# Altium footprint library Semi-ATE.PcbLib: 155 footprints (part 7 of 10)
Each footprint in its own frame and in the unit in brackets; x right, y up, seen from the top. Pads: shape width x height; smd on the part's side, far side on the other; paste and mask are expansions set on the pad; w line width, h text height; cw(c..) or ccw(c..) is an arc to the next point about the centre after c.
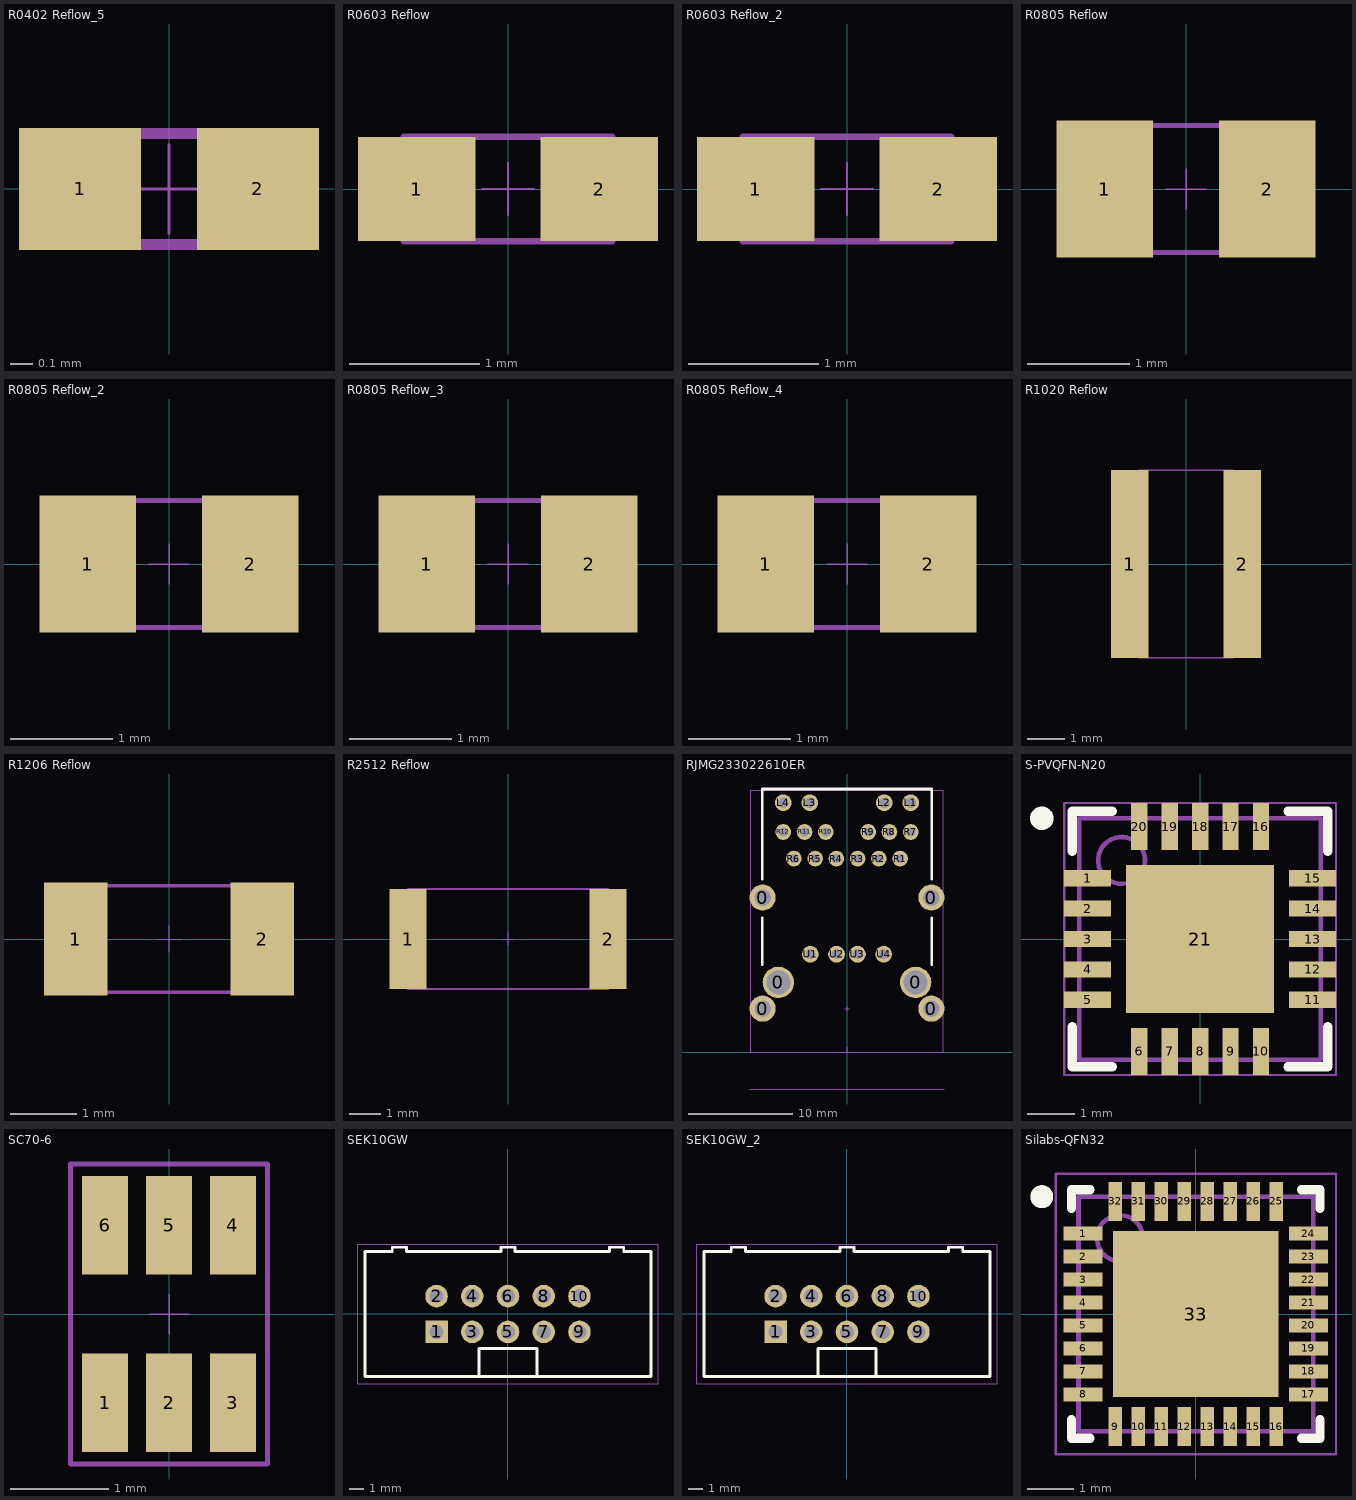
[diagram p6: the footprints below, top view; thin cyan lines are the x and y axes]

## R0402 Reflow_5 [mm]
pads (2):
  rect 0.55x0.55 smd: 1(-0.4,0) 2(0.4,0)
Top Solder:
  rectangle: -0.3,-0.377 0.3,0.377
Top Designator:
  text ".Designator" at -7.618,-0.508 h1.52
Top 3D Body:
  lines w0.05: -0.5,-0.25 -0.5,0.25 0.5,0.25 0.5,-0.25 -0.5,-0.25
Bottom Gold Plating:
  lines w0.013: -0.2,0 0.2,0 ; 0,-0.2 0,0.2
3D body "R0402.STEP": height 0.35, standoff 0, extent -0.5,-0.25 0.5,0.25

## R0603 Reflow [mm] "SMT Resistor 0603 Reflow Soldering"
pads (2):
  rect 0.9x0.8 smd: 1(-0.7,0) 2(0.7,0)
Top Designator:
  text ".Designator" at -7.618,-0.508 h1.52
Top 3D Body:
  lines w0.05: -0.8,-0.4 0.8,-0.4 0.8,0.4 -0.8,0.4 -0.8,-0.4
Bottom Gold Plating:
  lines w0.013: -0.2,0 0.2,0 ; 0,-0.2 0,0.2
3D body "R0603.STEP": height 0.45, standoff 0, extent -0.8,-0.4 0.8,0.4

## R0603 Reflow_2 [mm]
pads (2):
  rect 0.9x0.8 smd: 1(-0.7,0) 2(0.7,0)
Top Designator:
  text ".Designator" at -7.618,-0.508 h1.52
Top 3D Body:
  lines w0.05: -0.8,-0.4 0.8,-0.4 0.8,0.4 -0.8,0.4 -0.8,-0.4
Bottom Gold Plating:
  lines w0.013: -0.2,0 0.2,0 ; 0,-0.2 0,0.2
3D body "R0603.STEP": height 0.45, standoff 0, extent -0.8,-0.4 0.8,0.4

## R0805 Reflow [mm] "SMT Resistor 0805 Reflow Soldering"
height 10
pads (2):
  rect 0.95x1.35 smd: 1(-0.8,0) 2(0.8,0)
Top Designator:
  text ".Designator" at -7.618,-0.508 h1.52
Top 3D Body:
  lines w0.05: -1,-0.625 1,-0.625 1,0.625 -1,0.625 -1,-0.625
Bottom Gold Plating:
  lines w0.013: -0.2,0 0.2,0 ; 0,-0.2 0,0.2
3D body "R0805.STEP": height 0.6, standoff 0, extent -1,-0.625 1,0.625

## R0805 Reflow_2 [mm]
pads (2):
  rect 0.95x1.35 smd: 1(-0.8,0) 2(0.8,0)
Top Designator:
  text ".Designator" at -7.618,-0.508 h1.52
Top 3D Body:
  lines w0.05: -1,-0.625 -1,0.625 1,0.625 1,-0.625 -1,-0.625
Bottom Gold Plating:
  lines w0.013: -0.2,0 0.2,0 ; 0,-0.2 0,0.2
3D body "R0805.STEP": height 0.6, standoff 0, extent -1,-0.625 1,0.625

## R0805 Reflow_3 [mm]
pads (2):
  rect 0.95x1.35 smd: 1(-0.8,0) 2(0.8,0)
Top Designator:
  text ".Designator" at -7.618,-0.508 h1.52
Top 3D Body:
  lines w0.05: -1,-0.625 -1,0.625 1,0.625 1,-0.625 -1,-0.625
Bottom Gold Plating:
  lines w0.013: -0.2,0 0.2,0 ; 0,-0.2 0,0.2
3D body "R0805.STEP": height 0.6, standoff 0, extent -1,-0.625 1,0.625

## R0805 Reflow_4 [mm]
pads (2):
  rect 0.95x1.35 smd: 1(-0.8,0) 2(0.8,0)
Top Designator:
  text ".Designator" at -7.618,-0.508 h1.52
Top 3D Body:
  lines w0.05: -1,-0.625 1,-0.625 1,0.625 -1,0.625 -1,-0.625
Bottom Gold Plating:
  lines w0.013: -0.2,0 0.2,0 ; 0,-0.2 0,0.2
3D body "R0805.STEP": height 0.6, standoff 0, extent -1,-0.625 1,0.625

## R1020 Reflow [mm] "SMT Resistor 0805 Reflow Soldering"
pads (2):
  rect 1x5 smd: 1(-1.5,0) 2(1.5,0)
Top Designator:
  text ".Designator" at -7.618,-0.508 h1.52
Top 3D Body:
  lines w0.05: -1.25,-2.5 1.25,-2.5 1.25,2.5 -1.25,2.5 -1.25,-2.5
3D body "R1020.STEP": height 0.63, standoff -0.02, extent -1.25,-2.5 1.25,2.5

## R1206 Reflow [mm] "SMT Resistor 1206 Reflow Soldering"
pads (2):
  rect 0.95x1.7 smd: 1(-1.4,0) 2(1.4,0)
Top Designator:
  text ".Designator" at -7.618,-0.508 h1.52
Top 3D Body:
  lines w0.05: -1.6,-0.8 1.6,-0.8 1.6,0.8 -1.6,0.8 -1.6,-0.8
Bottom Gold Plating:
  lines w0.013: -0.2,0 0.2,0 ; 0,-0.2 0,0.2
3D body "R1206.STEP": height 0.6, standoff 0, extent -1.6,-0.8 1.6,0.8

## R2512 Reflow [mm] "SMT Resistor 2512 Reflow Soldering"
pads (2):
  rect 1.2x3.2 smd: 1(-3.2,0) 2(3.2,0)
Top Designator:
  text ".Designator" at -7.618,-0.508 h1.52
Top 3D Body:
  lines w0.05: -3.2,-1.6 3.2,-1.6 3.2,1.6 -3.2,1.6 -3.2,-1.6
Bottom Gold Plating:
  lines w0.013: -0.2,0 0.2,0 ; 0,-0.2 0,0.2
3D body "R2512.STEP": height 0.6, standoff 0, extent -3.2,-1.6 3.2,1.6

## RJMG233022610ER [mm] "RJ45 + USB"
pads (26):
  round 2.5 hole 1.57: 0(-8.065,4.18) 0(-8.065,14.8) 0(8.065,4.18) 0(8.065,14.8)
  round 3 hole 2.3: 0(-6.565,6.69) 0(6.565,6.69)
  round 1.6 hole 0.97: L1(6.09,23.87) L2(3.555,23.87) L3(-3.555,23.87) L4(-6.09,23.87) U1(-3.5,9.39) U2(-1,9.39) U3(1,9.39) U4(3.5,9.39)
  round 1.5 hole 0.89: R1(5.075,18.53) R2(3.045,18.53) R3(1.015,18.53) R4(-1.015,18.53) R5(-3.045,18.53) R6(-5.075,18.53) R7(6.09,21.07) R8(4.06,21.07) R9(2.03,21.07) R10(-2.03,21.07) R11(-4.06,21.07) R12(-6.09,21.07)
Top Overlay:
  lines w0.254: -8.1,8.38 -8.1,12.88 ; -8.1,16.58 -8.1,25.18 ; -8.065,25.18 8.1,25.18 8.1,16.58 ; 8.1,8.38 8.1,12.88
Top Designator:
  text ".Designator" at -7.618,-10.649 h1.52
Top 3D Body:
  lines w0.05: -9.209,0 -9.209,25.07 9.209,25.07 9.209,0 0,0 -9.209,0
Bottom Gold Plating:
  lines w0.012: 0,0 0,0.49
  lines w0.013: -9.3,-3.5 9.3,-3.5 ; -9.3,0 9.3,0 ; -0.2,4.18 0.2,4.18 ; 0,3.98 0,4.38
3D body "RJMG233022610ER.STEP": height 23, standoff -3.43, extent -9.209,-45.589 9.209,25.07

## S-PVQFN-N20 [mm] "(RGW) QFN 5mmx5mm, RM 0.65mm"
height 1
pads (21):
  rect 1x0.35 smd: 1(-2.4,1.3) 2(-2.4,0.65) 3(-2.4,0) 4(-2.4,-0.65) 5(-2.4,-1.3) 11(2.4,-1.3) 12(2.4,-0.65) 13(2.4,0) 14(2.4,0.65) 15(2.4,1.3)
  rect 0.35x1 smd: 6(-1.3,-2.4) 7(-0.65,-2.4) 8(0,-2.4) 9(0.65,-2.4) 10(1.3,-2.4) 16(1.3,2.4) 17(0.65,2.4) 18(0,2.4) 19(-0.65,2.4) 20(-1.3,2.4)
  rect 3.15x3.15 smd: 21(0,0)
Top Overlay:
  circle w0.25: c-3.375,2.575 r0.125
  lines w0.2: -2.725,-1.875 -2.725,-2.725 -1.875,-2.725 ; -2.725,1.875 -2.725,2.725 -1.875,2.725 ; 1.875,-2.725 2.725,-2.725 2.725,-1.875 ; 1.875,2.725 2.725,2.725 2.725,1.875
Top Designator:
  text ".Designator" at -7.929,-0.508 h1.52
Top 3D Body:
  lines w0.05: -2.9,-2.9 -2.9,2.9 2.9,2.9 2.9,-2.9 -2.9,-2.9
Bottom 3D Body:
  circle w0.1: c-1.675,1.675 r0.5
  lines w0.1: -2.575,-2.575 2.575,-2.575 2.575,2.575 -2.575,2.575 -2.575,-2.575
Bottom Gold Plating:
  lines w0.1: -0.5,0 0.5,0 ; 0,-0.5 0,0.5
3D body: height 1, standoff 0, extent -2.575,-2.575 2.575,2.575

## SC70-6 [mm]
pads (6):
  rect 0.47x1 smd: 1(-0.65,-0.9) 2(0,-0.9) 3(0.65,-0.9) 4(0.65,0.9) 5(0,0.9) 6(-0.65,0.9)
Top Overlay:
  text "." at -0.65,-1.784 h1
Top Designator:
  text ".Designator" at -7.64,-0.836 h1.52
Top 3D Body:
  lines w0.05: -1,-1.524 -1,1.524 1,1.524 1,-1.524 -1,-1.524
Bottom Gold Plating:
  lines w0.013: -0.2,0 0.2,0 ; 0,-0.2 0,0.2
3D body "SC70-6.STEP": height 0.95, standoff 0, extent -1,-1.05 1,1.05

## SEK10GW [mm]
height 9.45
pads (10):
  rect 1.6x1.6 hole 1: 1(-5.08,-1.27)
  round 1.6 hole 1: 2(-5.08,1.27) 3(-2.54,-1.27) 4(-2.54,1.27) 5(0,-1.27) 6(0,1.27) 7(2.54,-1.27) 8(2.54,1.27) 9(5.08,-1.27) 10(5.08,1.27)
Top Overlay:
  lines w0.2: -2.05,-4.45 -2.05,-2.45 2.05,-2.45 2.05,-4.45 ; 1.91,-4.45 10.16,-4.45 ; 2.81,-4.45 4.81,-4.45 ; 10.16,-4.45 10.16,4.45 8.22,4.45 8.22,4.75 7.22,4.75 7.22,4.45 0.5,4.45 0.5,4.75 -0.5,4.75 -0.5,4.45 -7.22,4.45 -7.22,4.75 -8.22,4.75 -8.22,4.45 -10.16,4.45 -10.16,-4.45 10.16,-4.45
Top Designator:
  text ".Designator" at -7.618,-0.508 h1.52
Top 3D Body:
  lines w0.05: -10.66,-4.95 -10.66,4.95 10.66,4.95 10.66,-4.95 -10.66,-4.95
Bottom 3D Body:
  lines w0.1: -5.395,-1.585 -5.395,-0.955 ; -5.395,-1.585 -5.395,-0.955 ; -5.395,-1.585 -4.765,-1.585 ; -5.395,-1.585 -4.765,-1.585 ; -5.395,-0.955 -4.765,-0.955 ; -5.395,-0.955 -4.765,-0.955 ; -5.395,0.955 -4.765,0.955 ; -5.395,0.955 -5.395,1.585 ; -5.395,0.955 -5.395,1.585 ; -5.395,0.955 -4.765,0.955 ; -5.395,1.585 -4.765,1.585 ; -5.395,1.585 -4.765,1.585 ; -4.765,-1.585 -4.765,-0.955 ; -4.765,-1.585 -4.765,-0.955 ; -4.765,0.955 -4.765,1.585 ; -4.765,0.955 -4.765,1.585 ; -2.855,-1.585 -2.225,-1.585 ; -2.855,-1.585 -2.855,-0.955 ; -2.855,-1.585 -2.855,-0.955 ; -2.855,-1.585 -2.225,-1.585 ; -2.855,-0.955 -2.225,-0.955 ; -2.855,-0.955 -2.225,-0.955 ; -2.855,0.955 -2.855,1.585 ; -2.855,0.955 -2.855,1.585 ; -2.855,0.955 -2.225,0.955 ; -2.855,0.955 -2.225,0.955 ; -2.855,1.585 -2.225,1.585 ; -2.855,1.585 -2.225,1.585 ; -2.225,-1.585 -2.225,-0.955 ; -2.225,-1.585 -2.225,-0.955 ; -2.225,0.955 -2.225,1.585 ; -2.225,0.955 -2.225,1.585 ; -0.315,-1.585 -0.315,-0.955 ; -0.315,-1.585 0.315,-1.585 ; -0.315,-1.585 -0.315,-0.955 ; -0.315,-1.585 0.315,-1.585 ; -0.315,-0.955 0.315,-0.955 ; -0.315,-0.955 0.315,-0.955 ; -0.315,0.955 -0.315,1.585 ; -0.315,0.955 -0.315,1.585 ; -0.315,0.955 0.315,0.955 ; -0.315,0.955 0.315,0.955 ; -0.315,1.585 0.315,1.585 ; -0.315,1.585 0.315,1.585 ; 0.315,-1.585 0.315,-0.955 ; 0.315,-1.585 0.315,-0.955 ; 0.315,0.955 0.315,1.585 ; 0.315,0.955 0.315,1.585 ; 2.225,-1.585 2.225,-0.955 ; 2.225,-1.585 2.225,-0.955 ; 2.225,-1.585 2.855,-1.585 ; 2.225,-1.585 2.855,-1.585 ; 2.225,-0.955 2.855,-0.955 ; 2.225,-0.955 2.855,-0.955 ; 2.225,0.955 2.225,1.585 ; 2.225,0.955 2.225,1.585 ; 2.225,0.955 2.855,0.955 ; 2.225,0.955 2.855,0.955 ; 2.225,1.585 2.855,1.585 ; 2.225,1.585 2.855,1.585 ; 2.855,-1.585 2.855,-0.955 ; 2.855,-1.585 2.855,-0.955 ; 2.855,0.955 2.855,1.585 ; 2.855,0.955 2.855,1.585 ; 4.765,-1.585 4.765,-0.955 ; 4.765,-1.585 4.765,-0.955 ; 4.765,-1.585 5.395,-1.585 ; 4.765,-1.585 5.395,-1.585 ; 4.765,-0.955 5.395,-0.955 ; 4.765,-0.955 5.395,-0.955 ; 4.765,0.955 4.765,1.585 ; 4.765,0.955 5.395,0.955 ; 4.765,0.955 5.395,0.955 ; 4.765,0.955 4.765,1.585 ; 4.765,1.585 5.395,1.585 ; 4.765,1.585 5.395,1.585 ; 5.395,-1.585 5.395,-0.955 ; 5.395,-1.585 5.395,-0.955 ; 5.395,0.955 5.395,1.585 ; 5.395,0.955 5.395,1.585
3D body "0918_SEK_low_profile_male_header_straight_10-pin_2_9_PCB.stp": height 9.4, standoff -3.25, extent -10.16,-4.45 10.16,4.75

## SEK10GW_2 [mm]
pads (10):
  rect 1.6x1.6 hole 1: 1(-5.08,-1.27)
  round 1.6 hole 1: 2(-5.08,1.27) 3(-2.54,-1.27) 4(-2.54,1.27) 5(0,-1.27) 6(0,1.27) 7(2.54,-1.27) 8(2.54,1.27) 9(5.08,-1.27) 10(5.08,1.27)
Top Overlay:
  lines w0.2: -2.05,-4.45 -2.05,-2.45 2.05,-2.45 2.05,-4.45 ; 1.91,-4.45 10.16,-4.45 ; 2.81,-4.45 4.81,-4.45 ; 10.16,-4.45 10.16,4.45 8.22,4.45 8.22,4.75 7.22,4.75 7.22,4.45 0.5,4.45 0.5,4.75 -0.5,4.75 -0.5,4.45 -7.22,4.45 -7.22,4.75 -8.22,4.75 -8.22,4.45 -10.16,4.45 -10.16,-4.45 10.16,-4.45
Top Designator:
  text ".Designator" at -7.618,-0.508 h1.52
Top 3D Body:
  lines w0.05: -10.66,-4.95 -10.66,4.95 10.66,4.95 10.66,-4.95 -10.66,-4.95
Bottom 3D Body:
  lines w0.1: -5.395,-1.585 -5.395,-0.955 ; -5.395,-1.585 -5.395,-0.955 ; -5.395,-1.585 -4.765,-1.585 ; -5.395,-1.585 -4.765,-1.585 ; -5.395,-0.955 -4.765,-0.955 ; -5.395,-0.955 -4.765,-0.955 ; -5.395,0.955 -4.765,0.955 ; -5.395,0.955 -5.395,1.585 ; -5.395,0.955 -5.395,1.585 ; -5.395,0.955 -4.765,0.955 ; -5.395,1.585 -4.765,1.585 ; -5.395,1.585 -4.765,1.585 ; -4.765,-1.585 -4.765,-0.955 ; -4.765,-1.585 -4.765,-0.955 ; -4.765,0.955 -4.765,1.585 ; -4.765,0.955 -4.765,1.585 ; -2.855,-1.585 -2.225,-1.585 ; -2.855,-1.585 -2.855,-0.955 ; -2.855,-1.585 -2.855,-0.955 ; -2.855,-1.585 -2.225,-1.585 ; -2.855,-0.955 -2.225,-0.955 ; -2.855,-0.955 -2.225,-0.955 ; -2.855,0.955 -2.855,1.585 ; -2.855,0.955 -2.855,1.585 ; -2.855,0.955 -2.225,0.955 ; -2.855,0.955 -2.225,0.955 ; -2.855,1.585 -2.225,1.585 ; -2.855,1.585 -2.225,1.585 ; -2.225,-1.585 -2.225,-0.955 ; -2.225,-1.585 -2.225,-0.955 ; -2.225,0.955 -2.225,1.585 ; -2.225,0.955 -2.225,1.585 ; -0.315,-1.585 -0.315,-0.955 ; -0.315,-1.585 0.315,-1.585 ; -0.315,-1.585 -0.315,-0.955 ; -0.315,-1.585 0.315,-1.585 ; -0.315,-0.955 0.315,-0.955 ; -0.315,-0.955 0.315,-0.955 ; -0.315,0.955 -0.315,1.585 ; -0.315,0.955 -0.315,1.585 ; -0.315,0.955 0.315,0.955 ; -0.315,0.955 0.315,0.955 ; -0.315,1.585 0.315,1.585 ; -0.315,1.585 0.315,1.585 ; 0.315,-1.585 0.315,-0.955 ; 0.315,-1.585 0.315,-0.955 ; 0.315,0.955 0.315,1.585 ; 0.315,0.955 0.315,1.585 ; 2.225,-1.585 2.225,-0.955 ; 2.225,-1.585 2.225,-0.955 ; 2.225,-1.585 2.855,-1.585 ; 2.225,-1.585 2.855,-1.585 ; 2.225,-0.955 2.855,-0.955 ; 2.225,-0.955 2.855,-0.955 ; 2.225,0.955 2.225,1.585 ; 2.225,0.955 2.225,1.585 ; 2.225,0.955 2.855,0.955 ; 2.225,0.955 2.855,0.955 ; 2.225,1.585 2.855,1.585 ; 2.225,1.585 2.855,1.585 ; 2.855,-1.585 2.855,-0.955 ; 2.855,-1.585 2.855,-0.955 ; 2.855,0.955 2.855,1.585 ; 2.855,0.955 2.855,1.585 ; 4.765,-1.585 4.765,-0.955 ; 4.765,-1.585 4.765,-0.955 ; 4.765,-1.585 5.395,-1.585 ; 4.765,-1.585 5.395,-1.585 ; 4.765,-0.955 5.395,-0.955 ; 4.765,-0.955 5.395,-0.955 ; 4.765,0.955 4.765,1.585 ; 4.765,0.955 5.395,0.955 ; 4.765,0.955 5.395,0.955 ; 4.765,0.955 4.765,1.585 ; 4.765,1.585 5.395,1.585 ; 4.765,1.585 5.395,1.585 ; 5.395,-1.585 5.395,-0.955 ; 5.395,-1.585 5.395,-0.955 ; 5.395,0.955 5.395,1.585 ; 5.395,0.955 5.395,1.585
3D body "0918_SEK_low_profile_male_header_straight_10-pin_2_9_PCB.stp": height 9.4, standoff -3.25, extent -10.16,-4.45 10.16,4.75

## Silabs-QFN32 [mm] "QFN, 32-Leads, Body 5.00x5.00mm, Pitch 0.50mm, Thermal Pad 3.60x3.60mm, IPC High Density"
height 1.1
pads (33):
  rect 0.85x0.3 smd: 1(-2.45,1.75) 2(-2.45,1.25) 3(-2.45,0.75) 4(-2.45,0.25) 5(-2.45,-0.25) 6(-2.45,-0.75) 7(-2.45,-1.25) 8(-2.45,-1.75) 17(2.45,-1.75) 18(2.45,-1.25) 19(2.45,-0.75) 20(2.45,-0.25) 21(2.45,0.25) 22(2.45,0.75) 23(2.45,1.25) 24(2.45,1.75)
  rect 0.3x0.85 smd: 9(-1.75,-2.45) 10(-1.25,-2.45) 11(-0.75,-2.45) 12(-0.25,-2.45) 13(0.25,-2.45) 14(0.75,-2.45) 15(1.25,-2.45) 16(1.75,-2.45) 25(1.75,2.45) 26(1.25,2.45) 27(0.75,2.45) 28(0.25,2.45) 29(-0.25,2.45) 30(-0.75,2.45) 31(-1.25,2.45) 32(-1.75,2.45)
  rect 3.6x3.6 smd: 33(0,0)
Top Overlay:
  circle w0.25: c-3.35,2.55 r0.125
  lines w0.2: -2.7,-2.3 -2.7,-2.7 -2.3,-2.7 ; -2.7,2.3 -2.7,2.7 -2.3,2.7 ; 2.3,-2.7 2.7,-2.7 2.7,-2.3 ; 2.3,2.7 2.7,2.7 2.7,2.3
Top Designator:
  text ".Designator" at -7.881,-0.508 h1.52
Top 3D Body:
  lines w0.05: -3.048,-3.048 3.048,-3.048 3.048,3.048 -3.048,3.048 -3.048,-3.048
Bottom 3D Body:
  circle w0.1: c-1.65,1.65 r0.5
  lines w0.1: -2.55,-2.55 2.55,-2.55 2.55,2.55 -2.55,2.55 -2.55,-2.55
3D body: height 1.1, standoff 0, extent -2.55,-2.55 2.55,2.55